# Altium footprint library SparkFun-Retired.PCBLIB: 303 footprints (part 7 of 19)
Each footprint in its own frame and in the unit in brackets; x right, y up, seen from the top. Pads: shape width x height; smd on the part's side, far side on the other; paste and mask are expansions set on the pad; w line width, h text height; cw(c..) or ccw(c..) is an arc to the next point about the centre after c.
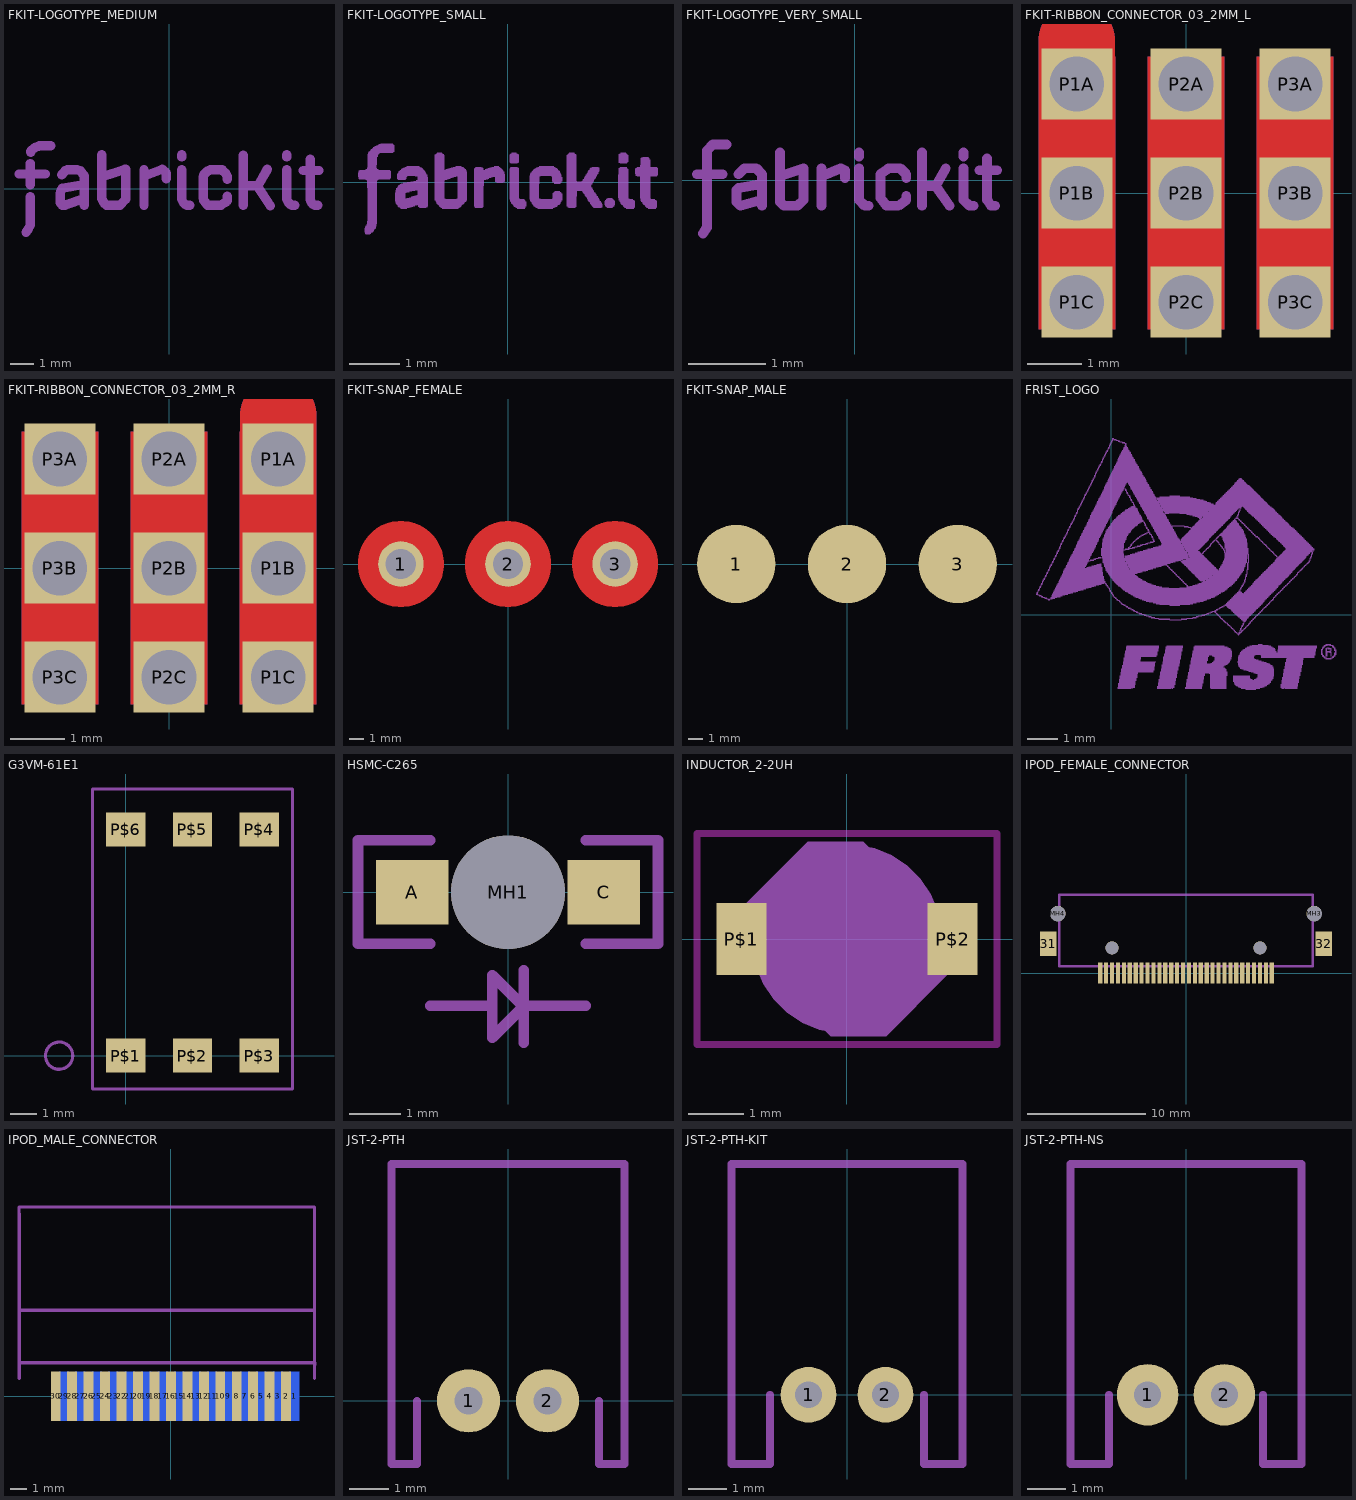
[diagram p6: the footprints below, top view; thin cyan lines are the x and y axes]

## FKIT-LOGOTYPE_MEDIUM [mil]
tPlace:
  lines w16: -256,25 -211,25 ; -244,-74 -240,-69 -237,-62 -237,-14 ; -237,7 -237,43 ; -236,62 -236,64 -234,66 -229,70 -221,73 -202,73 ; -183,24 -177,31 -174,32 -157,32 -152,31 -145,22 -145,-17 ; -146,7 -182,1 -185,-4 -186,-9 -186,-24 -182,-28 -177,-28 -145,-17 ; -145,-28 -145,-17 ; -115,58 -115,-17 -111,-25 -107,-28 -84,-28 -74,-18 -74,33 -76,33 -113,21 ; -43,-28 -43,32 ; -41,22 -12,33 -7,29 -5,26 -5,17 ; 21,32 21,-18 25,-25 28,-27 30,-28 35,-28 ; 21,54 21,58 ; 99,-13 99,-20 96,-23 88,-28 65,-28 59,-20 58,-16 58,20 59,24 65,30 70,32 90,32 96,26 99,21 99,16 ; 126,-28 126,57 ; 127,5 151,5 167,33 ; 150,4 172,-29 ; 200,32 200,-18 204,-25 207,-27 209,-28 214,-28 ; 200,54 200,58 ; 228,31 255,31 ; 240,50 240,-19 243,-25 246,-27 248,-28 253,-28

## FKIT-LOGOTYPE_SMALL [mil]
tPlace:
  drawing of 972 lines, arcs and shapes, not listed

## FKIT-LOGOTYPE_VERY_SMALL [mil]
tPlace:
  lines w5: -80,3 -67,3 ; -77,-27 -75,-24 -75,15 -72,18 -65,18 ; -59,3 -56,6 -50,6 -47,3 -47,-2 ; -47,-13 -47,-10 ; -38,14 -38,2 ; -17,-13 -17,2 ; -17,6 -17,2 ; -5,1 -5,5 -7,6 -17,2 ; 2,6 2,-10 5,-13 7,-13 ; 2,12 2,14 ; 26,-8 26,-10 22,-13 16,-13 13,-9 13,3 17,6 23,6 26,3 26,1 ; 34,-13 34,-3 ; 34,14 34,-3 ; 46,6 41,-3 ; 48,-13 41,-3 ; 55,6 55,-10 58,-13 60,-13 ; 55,12 55,14 ; 63,5 72,5 ; 67,11 67,-10 69,-13 71,-13 ; -47,-10 -47,-2 ; -47,-10 -58,-13 -60,-11 -60,-5 -59,-4 -47,-2 ; -38,2 -38,-11 -36,-13 -29,-13 -26,-10 -26,6 -38,2 ; 34,-3 41,-3

## FKIT-RIBBON_CONNECTOR_03_2MM_L [mm]
pads (9):
  rect 1.3x1.3 / inner round 1.201 / far side rect 1.3x1.3 hole 1: P1A(-2,2) P1B(-2,0) P1C(-2,-2) P2A(0,2) P2B(0,0) P2C(0,-2) P3A(2,2) P3B(2,0) P3C(2,-2)
Top:
  region: -2.701,-2.5 -2.701,2.5 -1.299,2.5 -1.299,-2.5
  region: -0.701,-2.5 -0.701,2.5 0.701,2.5 0.701,-2.5
  region: 1.299,-2.5 1.299,2.5 2.701,2.5 2.701,-2.5
  lines w1.402: -2,2.5 -2,2.8
Bottom:
  region: -2.701,-2.5 -2.701,2.5 -1.299,2.5 -1.299,-2.5
  region: -0.701,-2.5 -0.701,2.5 0.701,2.5 0.701,-2.5
  region: 1.299,-2.5 1.299,2.5 2.701,2.5 2.701,-2.5
  lines w1.402: -2,2.5 -2,2.8
Top Solder:
  region: -2.75,-2.6 -2.75,2.6 -1.25,2.6 -1.25,-2.6
  region: -0.75,-2.6 -0.75,2.6 0.75,2.6 0.75,-2.6
  region: 1.25,-2.6 1.25,2.6 2.75,2.6 2.75,-2.6
  lines w1.5: -2,2.75 -2,2.8
Bottom Solder:
  region: -2.75,-2.6 -2.75,2.6 -1.25,2.6 -1.25,-2.6
  region: -0.75,-2.6 -0.75,2.6 0.75,2.6 0.75,-2.6
  region: 1.25,-2.6 1.25,2.6 2.75,2.6 2.75,-2.6
  lines w1.5: -2,2.75 -2,2.8

## FKIT-RIBBON_CONNECTOR_03_2MM_R [mm]
pads (9):
  rect 1.3x1.3 / inner round 1.201 / far side rect 1.3x1.3 hole 1: P1A(2,2) P1B(2,0) P1C(2,-2) P2A(0,2) P2B(0,0) P2C(0,-2) P3A(-2,2) P3B(-2,0) P3C(-2,-2)
Top:
  region: -2.701,-2.5 -2.701,2.5 -1.299,2.5 -1.299,-2.5
  region: -0.701,-2.5 -0.701,2.5 0.701,2.5 0.701,-2.5
  region: 1.299,-2.5 1.299,2.5 2.701,2.5 2.701,-2.5
  lines w1.402: 2,2.5 2,2.8
Bottom:
  region: -2.701,-2.5 -2.701,2.5 -1.299,2.5 -1.299,-2.5
  region: -0.701,-2.5 -0.701,2.5 0.701,2.5 0.701,-2.5
  region: 1.299,-2.5 1.299,2.5 2.701,2.5 2.701,-2.5
  lines w1.402: 2,2.5 2,2.8
Top Solder:
  region: -2.75,-2.6 -2.75,2.6 -1.25,2.6 -1.25,-2.6
  region: -0.75,-2.6 -0.75,2.6 0.75,2.6 0.75,-2.6
  region: 1.25,-2.6 1.25,2.6 2.75,2.6 2.75,-2.6
  lines w1.5: 2,2.75 2,2.8
Bottom Solder:
  region: -2.75,-2.6 -2.75,2.6 -1.25,2.6 -1.25,-2.6
  region: -0.75,-2.6 -0.75,2.6 0.75,2.6 0.75,-2.6
  region: 1.25,-2.6 1.25,2.6 2.75,2.6 2.75,-2.6
  lines w1.5: 2,2.75 2,2.8

## FKIT-SNAP_FEMALE [mil]
pads (3):
  round 127.5 hole 85: 1(-300,0) 2(0,0) 3(300,0)
Top:
  region: -420,0 -420,7.87 -417.95,23.46 -413.88,38.66 -407.86,53.19 -399.99,66.81 -390.41,79.29 -379.29,90.41 -366.81,99.99 -353.19,107.86 -338.66,113.88 -323.46,117.95 -307.87,120 -300,120 -292.13,120 -276.54,117.95 -261.34,113.88 -246.81,107.86 -233.19,99.99 -220.71,90.41 -209.59,79.29 -200.01,66.81 -192.14,53.19 -186.12,38.66 -182.05,23.46 -180,7.87 -180,0 -180,-7.87 -182.05,-23.46 -186.12,-38.66 -192.14,-53.19 -200.01,-66.81 -209.59,-79.29 -220.71,-90.41 -233.19,-99.99 -246.81,-107.86 -261.34,-113.88 -276.54,-117.95 -292.13,-120 -300,-120 -307.87,-120 -323.46,-117.95 -338.66,-113.88 -353.19,-107.86 -366.81,-99.99 -379.29,-90.41 -390.41,-79.29 -399.99,-66.81 -407.86,-53.19 -413.88,-38.66 -417.95,-23.46 -420,-7.87 -420,0
  region: -120,0 -120,7.87 -117.95,23.46 -113.88,38.66 -107.86,53.19 -99.99,66.81 -90.41,79.29 -79.29,90.41 -66.81,99.99 -53.19,107.86 -38.66,113.88 -23.46,117.95 -7.87,120 0,120 7.87,120 23.46,117.95 38.66,113.88 53.19,107.86 66.81,99.99 79.29,90.41 90.41,79.29 99.99,66.81 107.86,53.19 113.88,38.66 117.95,23.46 120,7.87 120,0 120,-7.87 117.95,-23.46 113.88,-38.66 107.86,-53.19 99.99,-66.81 90.41,-79.29 79.29,-90.41 66.81,-99.99 53.19,-107.86 38.66,-113.88 23.46,-117.95 7.87,-120 0,-120 -7.87,-120 -23.46,-117.95 -38.66,-113.88 -53.19,-107.86 -66.81,-99.99 -79.29,-90.41 -90.41,-79.29 -99.99,-66.81 -107.86,-53.19 -113.88,-38.66 -117.95,-23.46 -120,-7.87 -120,0
  region: 180,0 180,7.87 182.05,23.46 186.12,38.66 192.14,53.19 200.01,66.81 209.59,79.29 220.71,90.41 233.19,99.99 246.81,107.86 261.34,113.88 276.54,117.95 292.13,120 300,120 307.87,120 323.46,117.95 338.66,113.88 353.19,107.86 366.81,99.99 379.29,90.41 390.41,79.29 399.99,66.81 407.86,53.19 413.88,38.66 417.95,23.46 420,7.87 420,0 420,-7.87 417.95,-23.46 413.88,-38.66 407.86,-53.19 399.99,-66.81 390.41,-79.29 379.29,-90.41 366.81,-99.99 353.19,-107.86 338.66,-113.88 323.46,-117.95 307.87,-120 300,-120 292.13,-120 276.54,-117.95 261.34,-113.88 246.81,-107.86 233.19,-99.99 220.71,-90.41 209.59,-79.29 200.01,-66.81 192.14,-53.19 186.12,-38.66 182.05,-23.46 180,-7.87 180,0
Top Paste:
  drawing of 3 lines, arcs and shapes, not listed
Top Solder:
  drawing of 3 lines, arcs and shapes, not listed

## FKIT-SNAP_MALE [mil]
pads (3):
  rrect100% 212x212 smd: 1(-300,0) 2(0,0) 3(300,0)

## FRIST_LOGO [mil]
tPlace:
  drawing of 1936 lines, arcs and shapes, not listed

## G3VM-61E1 [mm]
pads (6):
  rect 1.5x1.3 smd: P$1(0,0) P$2(2.54,0) P$3(5.08,0) P$4(5.08,8.62) P$5(2.54,8.62) P$6(0,8.62)
tPlace:
  circle w0.127: c-2.54,0 r0.519
  lines w0.127: -1.27,-1.27 -1.27,10.16 6.35,10.16 6.35,-1.27 -1.27,-1.27

## HSMC-C265 [mil]
pads (3):
  rect 55.12x49.21 smd: A(-72.83,0) C(72.83,0)
  round 86.61 hole 86.61 unplated: MH1(0,0)
tPlace:
  lines w8: -59.06,-86.61 -11.81,-86.61 ; -59.06,-39.37 -114.17,-39.37 -114.17,39.37 -59.06,39.37 ; 11.81,-114.57 11.81,-87.01 ; 11.81,-59.45 11.81,-86.61 ; 59.06,-86.61 11.81,-86.61 ; 59.06,-39.37 114.17,-39.37 114.17,39.37 59.06,39.37 ; -11.81,-86.61 -11.81,-63.39 11.81,-87.01 ; -11.81,-86.61 -11.81,-110.63 11.81,-87.01 ; 11.81,-87.01 11.81,-86.61

## INDUCTOR_2-2UH [mil]
pads (2):
  rect 35.43x51.18 smd: P$1(-74.8,0) P$2(74.8,0)
Top keep-out:
  lines w5: -106.29,-74.8 106.31,-74.8 106.31,74.8 -106.29,74.8 -106.29,-74.8
tDocu:
  region: 0,-66.93 -6.59,-66.93 -19.52,-64.36 -31.7,-59.31 -42.67,-51.99 -51.99,-42.67 -59.31,-31.7 -64.36,-19.52 -66.93,-6.59 -66.93,0 -66.93,6.59 -64.36,19.52 -59.31,31.7 -51.99,42.67 -42.67,51.99 -31.7,59.31 -19.52,64.36 -6.59,66.93 0,66.93 6.59,66.93 19.52,64.36 31.7,59.31 42.67,51.99 51.99,42.67 59.31,31.7 64.36,19.52 66.93,6.59 66.93,0 66.93,-6.59 64.36,-19.52 59.31,-31.7 51.99,-42.67 42.67,-51.99 31.7,-59.31 19.52,-64.36 6.59,-66.93 0,-66.93
  region: -72.83,21.65 72.83,21.65 72.83,-21.65 -72.83,-21.65
  region: -70.87,19.69 -70.87,25.73 -27.69,68.9 11.59,68.9 19.69,60.81 19.69,19.69
  region: 70.87,-19.69 70.87,-25.73 27.69,-68.9 -11.59,-68.9 -19.69,-60.81 -19.69,-19.69

## IPOD_FEMALE_CONNECTOR [mm]
pads (36):
  rect 0.35x1.75 smd: 1(-7.25,0) 2(-6.75,0) 3(-6.25,0) 4(-5.75,0) 5(-5.25,0) 6(-4.75,0) 7(-4.25,0) 8(-3.75,0) 9(-3.25,0) 10(-2.75,0) 11(-2.25,0) 12(-1.75,0) 13(-1.25,0) 14(-0.75,0) 15(-0.25,0) 16(0.25,0) 17(0.75,0) 18(1.25,0) 19(1.75,0) 20(2.25,0) 21(2.75,0) 22(3.25,0) 23(3.75,0) 24(4.25,0) 25(4.75,0) 26(5.25,0) 27(5.75,0) 28(6.25,0) 29(6.75,0) 30(7.25,0)
  rect 1.4x2.05 smd: 31(-11.65,2.475) 32(11.65,2.475)
  round 1.1 hole 1.1 unplated: MH1(6.25,2.125) MH2(-6.25,2.125)
  round 1.3 hole 1.3 unplated: MH3(10.825,5.025) MH4(-10.825,5.025)
tDocu:
  lines w0.203: -10.7,0.575 10.7,0.575 10.7,6.625 -10.7,6.625 -10.7,0.575

## IPOD_MALE_CONNECTOR [mm]
pads (30):
  rect 0.6x3 smd far side paste+0: 1(7.5,0) 3(6.5,0) 5(5.5,0) 7(4.5,0) 9(3.5,0) 11(2.5,0) 13(1.5,0) 15(0.5,0) 17(-0.5,0) 19(-1.5,0) 21(-2.5,0) 23(-3.5,0) 25(-4.5,0) 27(-5.5,0) 29(-6.5,0)
  rect 0.6x3 smd paste+0: 2(7,0) 4(6,0) 6(5,0) 8(4,0) 10(3,0) 12(2,0) 14(1,0) 16(0,0) 18(-1,0) 20(-2,0) 22(-3,0) 24(-4,0) 26(-5,0) 28(-6,0) 30(-7,0)
tDocu:
  lines w0.203: -9.232,5.224 8.727,5.224 8.727,4.883 ; -9.229,2.027 8.733,2.027 8.733,1.914 ; -9.229,11.078 -9.229,11.497 8.727,11.497 8.727,4.883 ; -9.225,1.1 -9.225,11.1 ; 8.725,1.1 8.725,4.1 ; 8.727,4.089 8.727,4.883

## JST-2-PTH [mm]
pads (2):
  round 1.6 hole 0.7: 1(-1,0) 2(1,0)
tDocu:
  text "+" at 0.6,0.7 h1.97
  text "-" at -1.4,0.7 h1.97
tPlace:
  lines w0.203: -2.3,0 -2.3,-1.6 -2.95,-1.6 -2.95,6 2.95,6 2.95,-1.6 2.3,-1.6 2.3,0

## JST-2-PTH-KIT [mil]
pads (2):
  round 57 hole 27.56: 1(-39.37,0) 2(39.37,0)
Top Solder:
  region: -39.37,-11.28 -41.61,-11.28 -45.76,-9.57 -48.94,-6.39 -50.65,-2.24 -50.65,0 -50.65,2.24 -48.93,6.39 -45.76,9.56 -41.61,11.28 -39.37,11.28 -37.13,11.28 -32.98,9.56 -29.81,6.39 -28.09,2.24 -28.09,0 -28.09,-2.24 -29.81,-6.39 -32.98,-9.56 -37.13,-11.28 -39.37,-11.28
  region: 39.37,-11.28 37.13,-11.28 32.98,-9.57 29.8,-6.39 28.09,-2.24 28.09,0 28.09,2.24 29.81,6.39 32.98,9.56 37.13,11.28 39.37,11.28 41.61,11.28 45.76,9.56 48.93,6.39 50.65,2.24 50.65,0 50.65,-2.24 48.93,-6.39 45.76,-9.56 41.61,-11.28 39.37,-11.28
Bottom Solder:
  region: -39.27,-26 -41.84,-26.01 -46.87,-25.01 -51.62,-23.06 -55.89,-20.22 -59.52,-16.6 -62.38,-12.33 -64.36,-7.6 -65.37,-2.57 -65.37,0 -65.37,2.56 -64.37,7.58 -62.41,12.32 -59.57,16.57 -55.95,20.2 -51.69,23.04 -46.95,25 -41.93,26 -39.37,26 -36.81,26 -31.79,25 -27.05,23.04 -22.8,20.2 -19.17,16.57 -16.33,12.32 -14.37,7.58 -13.37,2.56 -13.37,0 -13.36,-2.56 -14.35,-7.57 -16.29,-12.3 -19.13,-16.56 -22.73,-20.18 -26.98,-23.03 -31.7,-24.99 -36.71,-26 -39.27,-26
  region: 39.47,-26 36.9,-26.01 31.87,-25.01 27.12,-23.06 22.85,-20.22 19.22,-16.6 16.36,-12.33 14.38,-7.6 13.37,-2.57 13.37,0 13.37,2.56 14.37,7.58 16.33,12.32 19.17,16.57 22.79,20.2 27.05,23.04 31.79,25 36.81,26 39.37,26 41.93,26 46.95,25 51.69,23.04 55.94,20.2 59.57,16.57 62.41,12.32 64.37,7.58 65.37,2.56 65.37,0 65.38,-2.56 64.39,-7.57 62.45,-12.3 59.61,-16.56 56.01,-20.18 51.76,-23.03 47.04,-24.99 42.03,-26 39.47,-26
tDocu:
  lines w8: -78.74,0 -78.74,-70.87 -118.11,-70.87 -118.11,236.22 118.11,236.22 118.11,-70.87 78.74,-70.87 78.74,0
  text "+" at 23.62,27.56 h77.5
  text "-" at -55.12,27.56 h77.5

## JST-2-PTH-NS [mm]
pads (2):
  round 1.6 hole 0.7: 1(-1,0) 2(1,0)
tDocu:
  lines w0.203: -2,0 -2,-1.8 -3,-1.8 -3,6 3,6 3,-1.8 2,-1.8 2,0
  text "+" at 0.6,0.7 h1.97
  text "-" at -1.4,0.7 h1.97